# Altium footprint library 3D封装库.PcbLib: 716 footprints (part 2 of 45)
Each footprint in its own frame and in the unit in brackets; x right, y up, seen from the top. Pads: shape width x height; smd on the part's side, far side on the other; paste and mask are expansions set on the pad; w line width, h text height; cw(c..) or ccw(c..) is an arc to the next point about the centre after c.
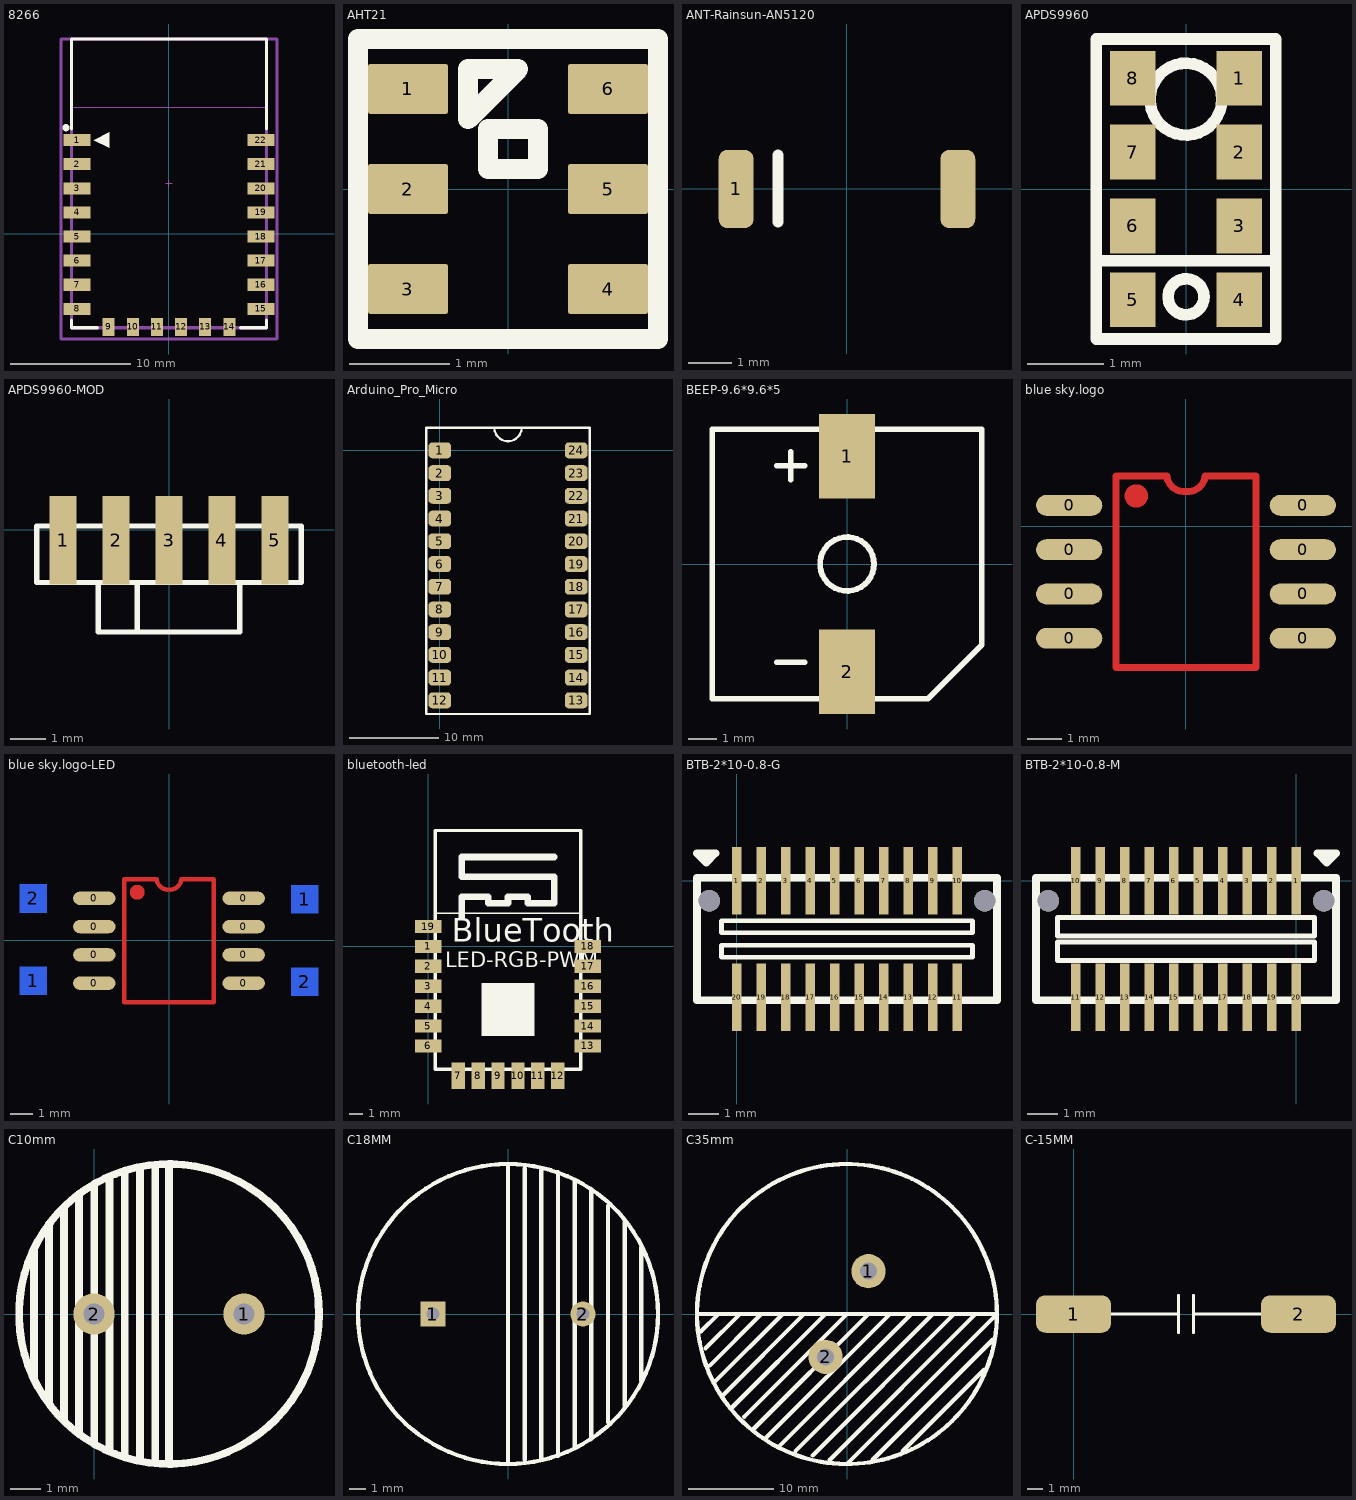
[diagram p1: the footprints below, top view; thin cyan lines are the x and y axes]

## 8266 [mm]
pads (22):
  rect 2.25x1 smd: 1(-7.625,7.75) 2(-7.625,5.75) 3(-7.625,3.75) 4(-7.625,1.75) 5(-7.625,-0.25) 6(-7.625,-2.25) 7(-7.625,-4.25) 8(-7.625,-6.25) 15(7.625,-6.25) 16(7.625,-4.25) 17(7.625,-2.25) 18(7.625,-0.25) 19(7.625,1.75) 20(7.625,3.75) 21(7.625,5.75) 22(7.625,7.75)
  rect 1x1.5 smd: 9(-5,-7.75) 10(-3,-7.75) 11(-1,-7.75) 12(1,-7.75) 13(3,-7.75) 14(5,-7.75)
Top Overlay:
  circle w0.3: c-8.55,8.775 r0.15
  region: -6.23,7.75 -4.96,7.115 -4.96,8.385
  lines w0.254: -8.084,-7.166 -8.084,-7.818 -5.932,-7.818 ; -8.084,8.667 -8.084,16.121 8.084,16.121 8.084,8.666 ; 5.932,-7.818 8.084,-7.818 8.084,-7.166
Mechanical 13:
  lines w0.051: -8.127,10.477 -8.127,16.132 8.129,16.132 8.129,10.477 -8.127,10.477
  lines w0.254: -8.084,-7.818 8.084,-7.818 8.084,16.121 -8.084,16.121 -8.084,-7.818
Mechanical 15:
  lines w0.1: -0.254,4.152 0.254,4.152 ; 0,3.898 0,4.406
  lines w0.254: -8.975,-8.75 -8.975,16.121 8.975,16.121 8.975,-8.75 -8.975,-8.75
3D body "ESP_12_E.STEP": height 2.75, standoff 0.04, extent -7.999,-7.741 8.001,16.259

## AHT21 [mm] "温湿度传感器"
pads (6):
  rrect10% 0.8x0.5 smd: 1(-1,1) 2(-1,0) 3(-1,-1) 4(1,-1) 5(1,0) 6(1,1)
Top Overlay:
  lines w0.203: -1.5,-1.5 -1.5,1.5 1.5,1.5 1.5,-1.5 -1.5,-1.5 ; -0.4,0.7 0.1,1.2 -0.4,1.2 -0.4,0.7 ; -0.2,0.2 0.3,0.2 0.3,0.6 -0.2,0.6 -0.2,0.2
3D body: height 0.8, standoff 0, extent -1.5,-1.5 1.5,1.5
3D body: height 0.7, standoff 0.5, extent -0.5,0 0.5,1
3D body: height 0.5, standoff 0, extent -1.5,-1.5 1.5,1.5

## ANT-Rainsun-AN5120 [mm] "选择焊盘"
pads (2):
  rrect50% 0.8x1.8 smd: 1(-2.54,0) ""(2.563,0)
Top Overlay:
  lines w0.254: -1.575,-0.762 -1.575,0.787
3D body "123.stp": height 1.32, standoff -0.01, extent -2.573,-0.911 2.542,0.935

## APDS9960 [mm]
pads (8):
  rect 0.6x0.72 smd mask+0.051: 1(0.7,1.455) 2(0.7,0.485) 3(0.7,-0.485) 4(0.7,-1.455) 5(-0.7,-1.455) 6(-0.7,-0.485) 7(-0.7,0.485) 8(-0.7,1.455)
Top Overlay:
  circle w0.152: c0,-1.416 r0.236
  circle w0.152: c0,1.18 r0.472
  lines w0.152: -1.18,-0.944 1.18,-0.944 ; -1.18,-1.97 -1.18,1.97 1.18,1.97 1.18,-1.97 -1.18,-1.97
3D body "APDS-9960.STEP": height 1.35, standoff 0, extent -1.18,-1.97 1.18,1.97

## APDS9960-MOD [mm]
pads (5):
  rect 0.762x2.5 smd mask+0.051: 1(-3,-0.3) 2(-1.5,-0.3) 3(0,-0.3) 4(1.5,-0.3) 5(3,-0.3)
Top Overlay:
  lines w0.152: -2,-1.5 -2,-2.9 2,-2.9 2,-1.5 ; -0.9,-2.9 -0.9,-1.5 ; -3.75,-1.5 -3.75,0.1 3.75,0.1 3.75,-1.5 -3.75,-1.5
3D body "APDS9960.step": height 3.4, standoff 0, extent -3.75,-2.85 3.75,0.1

## Arduino_Pro_Micro [mil]
pads (24):
  rrect50% 100x70 smd: 1(0,0) 2(0,-100) 3(0,-200) 4(0,-300) 5(0,-400) 6(0,-500) 7(0,-600) 8(0,-700) 9(0,-800) 10(0,-900) 11(0,-1000) 12(0,-1100) 13(600,-1100) 14(600,-1000) 15(600,-900) 16(600,-800) 17(600,-700) 18(600,-600) 19(600,-500) 20(600,-400) 21(600,-300) 22(600,-200) 23(600,-100) 24(600,0)
Top Overlay:
  lines w10: 240,100 ccw(c300,100) 360,100 ; -60,-1160 -60,100 660,100 660,-1160 -60,-1160

## BEEP-9.6*9.6*5 [mm]
pads (2):
  rect 2x3 smd: 1(0,3.84) 2(0,-3.84)
Top Overlay:
  circle w0.203: c0,0 r0.96
  lines w0.203: -2.5,-3.5 -1.5,-3.5 ; -2.5,3.5 -1.5,3.5 ; -2,3 -2,4 ; -4.8,-4.8 2.88,-4.8 4.8,-2.88 4.8,4.8 -4.8,4.8 -4.8,-4.8

## blue sky.logo [mm]
pads (8):
  oval 1.9x0.6 smd: 0(-3.35,-3.205) 0(-3.35,-1.935) 0(-3.35,-0.665) 0(-3.35,0.605) 0(3.35,-3.205) 0(3.35,-1.935) 0(3.35,-0.665) 0(3.35,0.605)
Top Layer:
  circle w0.508: c-1.425,0.875 r0.079
  lines w0.2: -2,-4.05 2,-4.05 2,1.45 0.55,1.45 cw(c0.05,1.5) 0,1 cw(c-0.05,1.5) -0.55,1.45 -2,1.45 -2,-4.05
  text "sky." at -0.7,0.9 h4.5
Top Solder:
  circle w0.508: c-1.425,0.875 r0.079
  lines w0.2: -2,-4.05 2,-4.05 2,1.45 0.55,1.45 cw(c0.05,1.5) 0,1 cw(c-0.05,1.5) -0.55,1.45 -2,1.45 -2,-4.05
  text "sky." at -0.7,0.9 h4.5

## blue sky.logo-LED [mm]
pads (12):
  oval 1.9x0.6 smd: 0(-3.35,-1.935) 0(-3.35,-0.665) 0(-3.35,0.605) 0(-3.35,1.875) 0(3.35,-1.935) 0(3.35,-0.665) 0(3.35,0.605) 0(3.35,1.875)
  rect 1.2x1.27 smd far side: 1(-6.096,-1.829) 1(6.096,1.829) 2(-6.096,1.871) 2(6.096,-1.871)
Top Layer:
  circle w0.508: c-1.425,2.145 r0.079
  lines w0.2: -2,-2.78 2,-2.78 2,2.72 0.55,2.72 cw(c0.05,2.77) 0,2.27 cw(c-0.05,2.77) -0.55,2.72 -2,2.72 -2,-2.78
  text "sky." at -0.7,2.17 h4.5
Bottom Overlay:
  lines w0.1: -5.207,-0.33 -4.953,-0.584 ; -5.207,0.178 -4.953,-0.076 ; -5.182,-0.584 -4.953,-0.584 ; -5.182,-0.076 -4.953,-0.076 ; -4.953,-0.356 -4.953,-0.584 ; -4.953,0.152 -4.953,-0.076 ; 4.953,-0.152 4.953,0.076 ; 4.953,0.356 4.953,0.584 ; 5.182,0.076 4.953,0.076 ; 5.182,0.584 4.953,0.584 ; 5.207,-0.178 4.953,0.076 ; 5.207,0.33 4.953,0.584
  lines w0.15: -6.731,0.33 -5.461,0.33 ; -6.096,-1.067 -6.096,1.092 ; 5.461,-0.33 6.731,-0.33 ; 6.096,-1.092 6.096,1.067 ; -6.731,-0.305 -6.096,0.33 -5.461,-0.305 -6.731,-0.305 ; 5.461,0.305 6.731,0.305 6.096,-0.33 5.461,0.305
Top Solder:
  circle w0.508: c-1.425,2.145 r0.079
  rectangle: -4.826,-3.175 4.826,3.175
  lines w0.2: -2,-2.78 2,-2.78 2,2.72 0.55,2.72 cw(c0.05,2.77) 0,2.27 cw(c-0.05,2.77) -0.55,2.72 -2,2.72 -2,-2.78
Bottom Solder:
  rectangle: -4.826,-3.175 4.826,3.175

## bluetooth-led [mm]
pads (19):
  rect 2x1 smd: 1(0,0) 2(0,-1.5) 3(0,-3) 4(0,-4.5) 5(0,-6) 6(0,-7.5) 13(12,-7.5) 14(12,-6) 15(12,-4.5) 16(12,-3) 17(12,-1.5) 18(12,0) 19(0,1.5)
  rect 1x2 smd: 7(2.25,-9.75) 8(3.75,-9.75) 9(5.25,-9.75) 10(6.75,-9.75) 11(8.25,-9.75) 12(9.75,-9.75)
Top Overlay:
  region: 8,-6.75 8,-2.75 4,-2.75 4,-6.75
  lines w0.1: 0.5,2.5 11.5,2.5
  lines w0.254: 0.5,-9.25 0.5,8.75 11.5,8.75 11.5,-9.25 0.5,-9.25
  lines w0.5: 2.5,2.25 2.5,3.75 4.5,3.75 4.5,3.25 6,3.25 6,3.75 7.5,3.75 7.5,3.25 9.5,3.25 9.5,5.25 2.5,5.25 2.5,6.75 9.5,6.75
  text "LED-RGB-PWM" at 1.25,-2 h2
  text "BlueTooth" at 1.75,-0.25 h3
Top Solder:
  region: 12,2.5 12,9.25 0,9.25 0,2.5
Bottom Solder:
  region: 12,2.5 12,9.25 0,9.25 0,2.5

## BTB-2*10-0.8-G [mm]
pads (20):
  rect 0.3x2.2 smd: 1(0,0) 2(0.8,0) 3(1.6,0) 4(2.4,0) 5(3.2,0) 6(4,0) 7(4.8,0) 8(5.6,0) 9(6.4,0) 10(7.2,0) 11(7.2,-3.8) 12(6.4,-3.8) 13(5.6,-3.8) 14(4.8,-3.8) 15(4,-3.8) 16(3.2,-3.8) 17(2.4,-3.8) 18(1.6,-3.8) 19(0.8,-3.8) 20(0,-3.8)
via 8.1,-0.65 diameter 0.7 hole 0.7
via -0.9,-0.65 diameter 0.7 hole 0.7
Top Overlay:
  lines w0.152: -0.5,-2.5 7.7,-2.5 7.7,-2.1 -0.5,-2.1 -0.5,-2.5 ; -0.5,-1.7 -0.5,-1.3 7.7,-1.3 7.7,-1.7 -0.5,-1.7
  lines w0.254: -1.3,-3.9 8.5,-3.9 8.5,0.1 -1.3,0.1 -1.3,-3.9 ; -1.3,0.9 -1,0.6 -0.7,0.9 -1.3,0.9

## BTB-2*10-0.8-M [mm]
pads (20):
  rect 0.3x2.2 smd: 1(0,0) 2(-0.8,0) 3(-1.6,0) 4(-2.4,0) 5(-3.2,0) 6(-4,0) 7(-4.8,0) 8(-5.6,0) 9(-6.4,0) 10(-7.2,0) 11(-7.2,-3.8) 12(-6.4,-3.8) 13(-5.6,-3.8) 14(-4.8,-3.8) 15(-4,-3.8) 16(-3.2,-3.8) 17(-2.4,-3.8) 18(-1.6,-3.8) 19(-0.8,-3.8) 20(0,-3.8)
via -8.1,-0.65 diameter 0.7 hole 0.7
via 0.9,-0.65 diameter 0.7 hole 0.7
Top Overlay:
  lines w0.152: -7.8,-2.6 -7.8,-2 0.6,-2 0.6,-2.6 -7.8,-2.6 ; -7.8,-1.8 0.6,-1.8 0.6,-1.2 -7.8,-1.2 -7.8,-1.8
  lines w0.254: -8.5,-3.9 1.3,-3.9 1.3,0.1 -8.5,0.1 -8.5,-3.9 ; 0.7,0.9 1,0.6 1.3,0.9 0.7,0.9

## C10mm [mm]
pads (2):
  round 1.38 hole 0.7: 1(5,0) 2(0,0)
Top Overlay:
  circle w0.254: c2.5,0 r5
  lines w0.254: -2,-2.1 -2,2.1 ; -1.5,-2.969 -1.5,3 ; -1,-3.5 -1,3.5 ; -0.5,-4 -0.5,4 ; 0.008,-4.318 0.008,4.318 ; 0.516,-4.572 0.516,4.572 ; 1.024,-4.699 1.024,4.699 ; 1.532,-4.826 1.532,4.826 ; 2.04,-4.826 2.04,4.953 ; 2.5,-5 2.5,5
3D body: height 17, standoff 0, extent -2.5,-4.996 7.5,5

## C18MM [mm]
pads (2):
  rect 1.5x1.5 hole 0.8: 1(-4.5,0)
  round 1.5 hole 0.8: 2(4.5,0)
Top Overlay:
  circle w0.254: c0,0 r9
  lines w0.254: 0,-9 0,9 ; 1,-8.75 1,8.75 ; 2,-8.75 2,8.75 ; 3,-8.5 3,8.5 ; 4,-8 4,8 ; 5,-7.5 5,7.5 ; 6,-6.5 6,6.5 ; 7,-5.5 7,5.5 ; 8,-4 8,4

## C35mm [mm]
pads (2):
  round 4 hole 2: 1(2.5,5) 2(-2.5,-5)
Top Overlay:
  circle w0.5: c0,0 r17.5
  lines w0.5: -17.5,0 17.5,0 0,-17.5 ; -17,-2 -15,0 ; -16.5,-4 -12.5,0 ; -16,-6 -10,0 ; -15.5,-8 -7.5,0 ; -14.5,-9.5 -5,0 ; -13.5,-11 -2.5,0 ; -12,-12 0,0 ; -11,-13.5 2.5,0 ; -9.5,-14.5 5,0 ; -8,-15.5 7.5,0 ; -6,-16 10,0 ; -4,-16.5 12.5,0 ; -2,-17 15,0 ; 3,-17 17,-3 ; 6.5,-16 16,-6.5 ; -15,0 -15,0 ; 15,0 15,0

## C-15MM [mm]
pads (2):
  rrect50% 5x2.5 smd: 1(0,0) 2(15,0)
Top Overlay:
  lines w0.2: 1.75,0 2.5,0 7,0 ; 7,-1.25 7,1.25 ; 8,-1.25 8,1.25 ; 8,0 13.25,0